# Altium footprint library Electronic Devices_LIB.PcbLib: 410 footprints (part 16 of 26)
Each footprint in its own frame and in the unit in brackets; x right, y up, seen from the top. Pads: shape width x height; smd on the part's side, far side on the other; paste and mask are expansions set on the pad; w line width, h text height; cw(c..) or ccw(c..) is an arc to the next point about the centre after c.
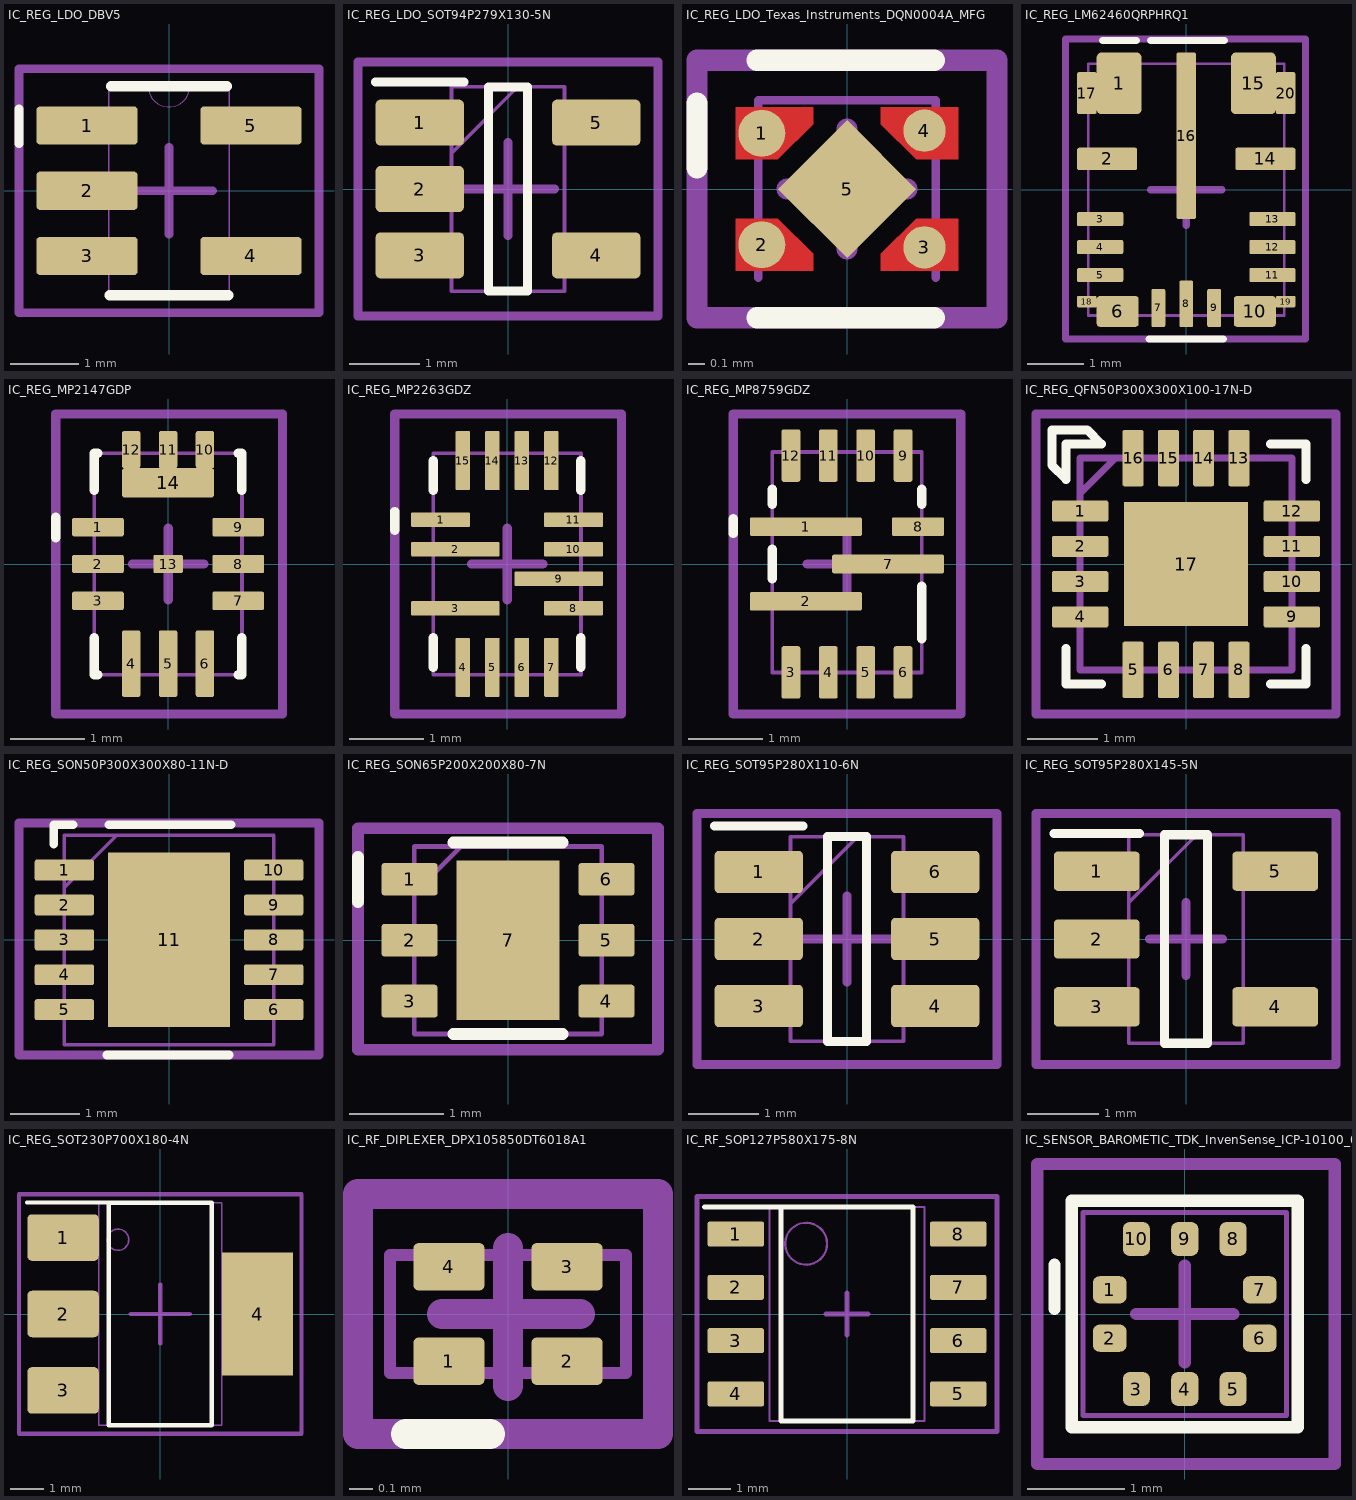
[diagram p15: the footprints below, top view; thin cyan lines are the x and y axes]

## IC_REG_LDO_DBV5 [mil]
pads (5):
  rrect20% 58x22 smd paste-29 mask-29: 1(-47,37.4) 2(-47,0) 3(-47,-37.4) 4(47,-37.4) 5(47,37.4)
Top Overlay:
  lines w5: -86,27 -86,47
  lines w6: -34,-60 34,-60 ; -33,60 33,60
Top Assembly:
  text ".Designator" at -98,-6.34 h20
Top Courtyard:
  lines w5: -25,0 0,0 ; 0,-25 0,0 ; 0,25 0,0 ; 25,0 0,0 ; -86,-70 86,-70 86,70 -86,70 -86,-70
Top 3D Body:
  lines w0: -12,60 ccw(c0,60) 12,60
  lines w1: -59,-47.4 -34.5,-47.4 -34.5,-27.4 -59,-27.4 -59,-47.4 ; -59,-10 -34.5,-10 -34.5,10 -59,10 -59,-10 ; -59,27.4 -34.5,27.4 -34.5,47.4 -59,47.4 -59,27.4 ; -34.5,-60 -34.5,60 34.5,60 34.5,-60 -34.5,-60 ; 34.5,-47.4 59,-47.4 59,-27.4 34.5,-27.4 34.5,-47.4 ; 34.5,27.4 59,27.4 59,47.4 34.5,47.4 34.5,27.4
3D body "DBV5.step": height 57.09, standoff 0, extent -59.02,-60 59.02,60

## IC_REG_LDO_SOT94P279X130-5N [mm]
pads (5):
  rrect20% 1.25x0.65 smd: 1(-1.25,0.94) 2(-1.25,0) 3(-1.25,-0.94) 4(1.25,-0.94) 5(1.25,0.94)
Top Overlay:
  lines w0.127: -1.875,1.514 -0.625,1.514 ; -0.275,-1.448 -0.275,1.448 0.275,1.448 0.275,-1.448 -0.275,-1.448
Top Assembly:
  lines w0.051: -0.8,0.508 0.14,1.448 ; -0.8,-1.448 -0.8,1.448 0.8,1.448 0.8,-1.448 -0.8,-1.448
  text ".Designator" at -2.565,-0.161 h0.51
Top Courtyard:
  lines w0.127: -0.66,0 0,0 ; 0,-0.66 0,0 ; 0,0.66 0,0 ; 0.66,0 0,0 ; -2.125,-1.8 -2.125,1.8 2.125,1.8 2.125,-1.8 -2.125,-1.8
3D body "RT9043GB.stp": height 1.3, standoff 0, extent -1.397,-1.448 1.397,1.448

## IC_REG_LDO_Texas_Instruments_DQN0004A_MFG [mm] "4-XDFN Exposed Pad"
height 0.4
pads (5):
  round 0.279 smd: 1(-0.505,0.33) 2(-0.505,-0.33)
  round 0.251 smd: 3(0.459,-0.346) 4(0.459,0.346)
  rect 0.58x0.58 smd rot 135 mask+0.051: 5(0,0)
Top Layer:
  region: -0.66,-0.485 -0.2,-0.485 -0.2,-0.385 -0.41,-0.175 -0.66,-0.175
  region: 0.66,0.485 0.2,0.485 0.2,0.385 0.41,0.175 0.66,0.175
  region: 0.66,-0.485 0.2,-0.485 0.2,-0.385 0.41,-0.175 0.66,-0.175
  region: -0.66,0.485 -0.2,0.485 -0.2,0.385 -0.41,0.175 -0.66,0.175
Top Overlay:
  lines w0.127: -0.889,0.127 -0.889,0.508 ; -0.533,-0.762 0.517,-0.762 ; -0.533,0.762 0.517,0.762
Top Paste:
  region: -0.318,0 0,-0.318 0.318,0 0,0.318
  region: 0.65,-0.435 0.25,-0.435 0.25,-0.405 0.43,-0.225 0.65,-0.225
  region: -0.65,-0.435 -0.25,-0.435 -0.25,-0.405 -0.43,-0.225 -0.65,-0.225
  region: 0.65,0.435 0.25,0.435 0.25,0.405 0.43,0.225 0.65,0.225
  region: -0.65,0.435 -0.25,0.435 -0.25,0.405 -0.43,0.225 -0.65,0.225
Top Solder:
  region: -0.339,0 0,-0.339 0.339,0 0,0.339
  region: -0.61,-0.435 -0.25,-0.435 -0.25,-0.405 -0.43,-0.225 -0.61,-0.225
  region: 0.61,-0.435 0.25,-0.435 0.25,-0.405 0.43,-0.225 0.61,-0.225
  region: 0.61,0.435 0.25,0.435 0.25,0.405 0.43,0.225 0.61,0.225
  region: -0.61,0.435 -0.25,0.435 -0.25,0.405 -0.43,0.225 -0.61,0.225
Top Assembly:
  lines w0.051: -0.525,-0.525 -0.525,0.525 0.525,0.525 0.525,-0.525
  text ".Designator" at -2.21,-0.136 h0.51
Top Courtyard:
  lines w0.127: -0.356,0 0,0 ; 0,-0.356 0,0 ; 0,0.356 0,0 ; 0.356,0 0,0 ; -0.889,-0.762 0.889,-0.762 0.889,0.762 -0.889,0.762 -0.889,-0.762
3D body "IC_Texas_Instruments_LP590715QDQNRQ1_eec.STEP": height 0.25, standoff 0, extent -0.76,-0.625 0.76,0.625

## IC_REG_LM62460QRPHRQ1 [mm] "16-PowerVFQFN"
height 1
pads (20):
  rrect20% 0.8x1.1 smd mask+0.051: 1(-1.2,1.9) 15(1.2,1.9)
  rrect20% 1.075x0.4 smd mask+0.051: 2(-1.413,0.55) 14(1.413,0.55)
  rrect20% 0.825x0.25 smd mask+0.051: 3(-1.538,-0.525) 4(-1.538,-1.025) 5(-1.538,-1.525) 11(1.538,-1.525) 12(1.538,-1.025) 13(1.538,-0.525)
  rrect20% 0.75x0.55 smd mask+0.051: 6(-1.225,-2.175) 10(1.225,-2.175)
  rrect20% 0.25x0.675 smd mask+0.051: 7(-0.5,-2.113) 9(0.5,-2.113)
  rrect20% 0.25x0.825 smd mask+0.051: 8(0,-2.038)
  rrect20% 0.35x2.975 smd mask+0.051: 16(0,0.963)
  rrect20% 0.35x0.75 smd mask+0.051: 17(-1.775,1.725) 20(1.775,1.725)
  rrect20% 0.35x0.2 smd mask+0.051: 18(-1.775,-2) 19(1.775,-2)
Top Overlay:
  lines w0.127: -1.499,2.667 -0.889,2.667 ; -0.66,-2.667 0.66,-2.667 ; -0.635,2.667 0.686,2.667
Top Assembly:
  lines w0.051: -1.75,-2.25 1.75,-2.25 1.75,2.25 -1.75,2.25 -1.75,-2.25
  text ".Designator" at -2.616,-0.059 h0.51
Top Courtyard:
  lines w0.127: -0.635,0 0,0 ; 0,-0.635 0,0 ; 0,0.635 0,0 ; 0.635,0 0,0 ; -2.159,-2.667 -2.159,2.692 2.134,2.692 2.134,-2.667 -2.159,-2.667
3D body "LM61480Q3RPHRQ1.stp": height 1.1, standoff 0, extent -1.75,-2.25 1.75,2.25

## IC_REG_MP2147GDP [mm] "12-QFN (2x3)"
height 1
pads (14):
  rrect20% 0.7x0.25 smd: 1(-0.95,0.5) 2(-0.95,0) 3(-0.95,-0.5) 7(0.95,-0.5) 8(0.95,0) 9(0.95,0.5)
  rrect20% 0.25x0.9 smd: 4(-0.5,-1.35) 5(0,-1.35) 6(0.5,-1.35)
  rrect20% 0.25x0.5 smd: 10(0.5,1.55) 11(0,1.55) 12(-0.5,1.55)
  rrect20% 0.4x0.25 smd: 13(0,0)
  rrect20% 1.25x0.4 smd: 14(0,1.1)
Top Overlay:
  lines w0.127: -1.524,0.356 -1.524,0.635 ; -1,-1 -1,-1.5 -0.95,-1.5 ; -1,1 -1,1.5 -0.95,1.5 ; 0.95,-1.5 1,-1.5 1,-1 ; 0.95,1.5 1,1.5 1,1
Top Assembly:
  lines w0.051: -1,-1.5 1,-1.5 1,1.5 -1,1.5 -1,-1.5
  text ".Designator" at -2.489,-0.136 h0.51
Top Courtyard:
  lines w0.127: -0.483,0 0,0 ; 0,-0.483 0,0 ; 0,0.483 0,0 ; 0.483,0 0,0 ; -1.524,-2.032 1.549,-2.032 1.549,2.032 -1.524,2.032 -1.524,-2.032
3D body "MP2147GD-P.stp": height 1.1, standoff 0, extent -1,-1.5 1,1.5

## IC_REG_MP2263GDZ [mm] "15-QFN (3x2)"
height 1
pads (15):
  rrect20% 0.8x0.2 smd: 1(-0.9,0.6) 8(0.9,-0.6) 10(0.9,0.2) 11(0.9,0.6)
  rrect20% 1.2x0.2 smd: 2(-0.7,0.2) 3(-0.7,-0.6) 9(0.7,-0.2)
  rrect20% 0.2x0.8 smd: 4(-0.6,-1.4) 5(-0.2,-1.4) 6(0.2,-1.4) 7(0.6,-1.4) 12(0.6,1.4) 13(0.2,1.4) 14(-0.2,1.4) 15(-0.6,1.4)
Top Overlay:
  lines w0.127: -1.524,0.457 -1.524,0.711 ; -1,-1.4 -1,-1 ; -1,1 -1,1.4 ; 1,-1.4 1,-1 ; 1,1 1,1.4
Top Assembly:
  lines w0.051: -1,-1.5 -1,1.5 1,1.5 1,-1.5 -1,-1.5
  text ".Designator" at -2.591,-0.186 h0.51
Top Courtyard:
  lines w0.127: -0.483,0 0,0 ; 0,-0.483 0,0 ; 0,0.483 0,0 ; 0.483,0 0,0 ; -1.524,-2.032 -1.524,2.032 1.549,2.032 1.549,-2.032 -1.524,-2.032
3D body "MP2263GD-Z.stp": height 1.1, standoff 0, extent -1,-1.5 1,1.5

## IC_REG_MP8759GDZ [mm] "12-QFN (2x3)"
height 1
pads (12):
  rrect20% 1.5x0.25 smd: 1(-0.55,0.5) 2(-0.55,-0.5) 7(0.55,0)
  rrect20% 0.25x0.7 smd: 3(-0.75,-1.45) 4(-0.25,-1.45) 5(0.25,-1.45) 6(0.75,-1.45) 9(0.75,1.45) 10(0.25,1.45) 11(-0.25,1.45) 12(-0.75,1.45)
  rrect20% 0.7x0.25 smd: 8(0.95,0.5)
Top Overlay:
  lines w0.127: -1.524,0.408 -1.524,0.608 ; -1,-0.2 -1,0.2 ; -1,0.8 -1,1 ; 1,-1 1,-0.3 ; 1,0.8 1,1
Top Assembly:
  lines w0.051: -1,-1.45 -1,1.5 1,1.5 1,-1.45 -1,-1.45
  text ".Designator" at -2.464,-0.11 h0.51
Top Courtyard:
  lines w0.127: -0.533,0 0,0 ; 0,-0.533 0,0 ; 0,0.533 0,0 ; 0.533,0 0,0 ; -1.524,-2.007 1.524,-2.007 1.524,2.007 -1.524,2.007 -1.524,-2.007
3D body "MP8759GD-Z.stp": height 1, standoff 0, extent -1.03,-1.53 1.03,1.53

## IC_REG_QFN50P300X300X100-17N-D [mm]
pads (17):
  rrect20% 0.8x0.3 smd: 1(-1.5,0.75) 2(-1.5,0.25) 3(-1.5,-0.25) 4(-1.5,-0.75) 9(1.5,-0.75) 10(1.5,-0.25) 11(1.5,0.25) 12(1.5,0.75)
  rrect20% 0.3x0.8 smd: 5(-0.75,-1.5) 6(-0.25,-1.5) 7(0.25,-1.5) 8(0.75,-1.5) 13(0.75,1.5) 14(0.25,1.5) 15(-0.25,1.5) 16(-0.75,1.5)
  rect 1.75x1.75 smd: 17(0,0)
Top Overlay:
  lines w0.127: -1.7,-1.2 -1.7,-1.7 -1.2,-1.7 ; 1.2,-1.7 1.7,-1.7 1.7,-1.2 ; 1.2,1.7 1.7,1.7 1.7,1.2 ; -1.9,1.4 -1.7,1.2 -1.7,1.7 -1.2,1.7 -1.4,1.9 -1.9,1.9 -1.9,1.4
Top Courtyard:
  lines w0.127: -0.45,0 0,0 ; 0,-0.45 0,0 ; 0,0.45 0,0 ; 0.45,0 0,0 ; -2.125,-2.125 2.125,-2.125 2.125,2.125 -2.125,2.125 -2.125,-2.125
Top 3D Body:
  lines w0.1: -1.5,1 -1,1.5 ; -1.5,-1.5 1.5,-1.5 1.5,1.5 -1.5,1.5 -1.5,-1.5
3D body "TPS62133RGTR.stp": height 1, standoff 0, extent -1.5,-1.5 1.5,1.5

## IC_REG_SON50P300X300X80-11N-D [mm] "10-WFDFN Exposed Pad"
height 0.8
pads (11):
  rrect20% 0.85x0.3 smd mask+0.076: 1(-1.5,1) 2(-1.5,0.5) 3(-1.5,0) 4(-1.5,-0.5) 5(-1.5,-1) 6(1.5,-1) 7(1.5,-0.5) 8(1.5,0) 9(1.5,0.5) 10(1.5,1)
  rect 1.75x2.5 smd: 11(0,0)
Top Overlay:
  lines w0.127: -1.651,1.372 -1.651,1.651 -1.372,1.651 ; -0.889,-1.651 0.864,-1.651 ; -0.864,1.651 0.889,1.651
Top Assembly:
  lines w0.051: -1.5,0.75 -0.75,1.5 ; -1.5,-1.5 -1.5,1.5 1.5,1.5 1.5,-1.5 -1.5,-1.5
  text ".Designator" at -2.565,-0.161 h0.51
Top Courtyard:
  lines w0.127: -2.15,-1.651 2.15,-1.651 2.15,1.676 -2.15,1.676 -2.15,-1.651
3D body "TPS7A9401DSCR.stp": height 0.8, standoff 0, extent -1.55,-1.5 1.55,1.5

## IC_REG_SON65P200X200X80-7N [mm] "SOT-23-6 Thin, TSOT-23-6"
height 1.1
pads (7):
  rrect20% 0.6x0.35 smd: 1(-1.05,0.65) 2(-1.05,0) 3(-1.05,-0.65) 4(1.05,-0.65) 5(1.05,0) 6(1.05,0.65)
  rect 1.1x1.7 smd mask+0.051: 7(0,0)
Top Overlay:
  lines w0.127: -1.6,0.406 -1.6,0.889 ; -0.584,-1 0.584,-1 ; -0.584,1.041 0.584,1.041
Top Assembly:
  lines w0.051: -1,0.5 -0.5,1 ; -1,-1 -1,1 1,1 1,-1 -1,-1
  text ".Designator" at -2.54,-0.161 h0.51
Top Courtyard:
  lines w0.127: -0.432,0 0,0 ; 0,-0.432 0,0 ; 0,0.432 0,0 ; 0.432,0 0,0 ; -1.6,-1.168 -1.6,1.194 1.6,1.194 1.6,-1.168 -1.6,-1.168
3D body "TPS61240TDRVRQ1.stp": height 0.8, standoff 0, extent -1,-1 1,1

## IC_REG_SOT95P280X110-6N [mm] "SOT-23-6 Thin, TSOT-23-6"
height 1.1
pads (6):
  rrect20% 1.25x0.6 smd: 1(-1.25,0.95) 2(-1.25,0) 3(-1.25,-0.95) 4(1.25,-0.95) 5(1.25,0) 6(1.25,0.95)
Top Overlay:
  lines w0.127: -1.875,1.6 -0.625,1.6 ; -0.275,-1.45 0.275,-1.45 0.275,1.45 -0.275,1.45 -0.275,-1.45
Top Assembly:
  lines w0.051: -0.8,0.5 0.15,1.45 ; -0.8,-1.45 -0.8,1.45 0.8,1.45 0.8,-1.45 -0.8,-1.45
  text ".Designator" at -2.616,-0.186 h0.51
Top Courtyard:
  lines w0.127: -0.61,0 0,0 ; 0,-0.61 0,0 ; 0,0.61 0,0 ; 0.61,0 0,0 ; -2.125,-1.775 2.125,-1.775 2.125,1.775 -2.125,1.775 -2.125,-1.775
3D body "TPS562200DDCT.stp": height 0.97, standoff 0, extent -1.4,-1.45 1.4,1.45

## IC_REG_SOT95P280X145-5N [mm] "SOT-23-5"
height 1.45
pads (5):
  rrect20% 1.2x0.55 smd: 1(-1.25,0.95) 2(-1.25,0) 3(-1.25,-0.95) 4(1.25,-0.95) 5(1.25,0.95)
Top Overlay:
  lines w0.127: -1.85,1.475 -0.65,1.475 ; -0.3,-1.46 0.3,-1.46 0.3,1.46 -0.3,1.46 -0.3,-1.46
Top Assembly:
  lines w0.051: -0.8,0.51 0.15,1.46 ; -0.8,-1.46 0.8,-1.46 0.8,1.46 -0.8,1.46 -0.8,-1.46
  text ".Designator" at -2.667,-0.161 h0.51
Top Courtyard:
  lines w0.127: -0.508,0 0,0 ; 0,-0.508 0,0 ; 0,0.508 0,0 ; 0.508,0 0,0 ; -2.1,-1.76 2.1,-1.76 2.1,1.76 -2.1,1.76 -2.1,-1.76
3D body "AP2202K-3.3TRG1.stp": height 1.45, standoff 0, extent -1.4,-1.46 1.4,1.46

## IC_REG_SOT230P700X180-4N [mm] "SOT223, 4-Leads, Body 6.50x7.00mm (avg), Pitch 2.30mm, IPC Medium Density"
height 1.8
pads (4):
  rrect20% 2.15x1.4 smd: 1(-2.925,2.3) 2(-2.925,0) 3(-2.925,-2.3)
  rect 2.15x3.7 smd: 4(2.925,0)
Top Overlay:
  lines w0.127: -4.013,3.353 -1.55,3.353 -1.55,-3.35 1.55,-3.35 1.55,3.35 -1.55,3.35
Top Assembly:
  circle w0.051: c-1.27,2.235 r0.321
  lines w0.051: -1.85,-3.35 1.85,-3.35 1.85,3.35 -1.85,3.35 -1.85,-3.35
  text ".Designator" at -2.616,-0.161 h0.51
Top Courtyard:
  lines w0.127: -0.889,0 0,0 ; 0,-0.889 0,0 ; 0,0.889 0,0 ; 0.889,0 0,0 ; -4.25,-3.6 4.25,-3.6 4.25,3.6 -4.25,3.6 -4.25,-3.6
3D body "AZ1117IH-5.0TRG1.STEP": height 1.65, standoff 0, extent -3.5,-3.199 3.5,3.301

## IC_RF_DIPLEXER_DPX105850DT6018A1 [mm] "0402 (1005 Metric), 4 PC Pad"
height 0.5
pads (4):
  rrect20% 0.3x0.2 smd: 1(-0.25,-0.2) 2(0.25,-0.2) 3(0.25,0.2) 4(-0.25,0.2)
Top Overlay:
  lines w0.127: -0.432,-0.508 -0.076,-0.508
Top Assembly:
  lines w0.051: -0.5,-0.25 0.5,-0.25 0.5,0.25 -0.5,0.25 -0.5,-0.25
  text ".Designator" at -2.591,-0.212 h0.51
Top Courtyard:
  lines w0.127: -0.279,0 0,0 0,0.279 ; 0,-0.305 0,-0.025 ; 0.025,0 0.305,0 ; -0.635,-0.508 0.635,-0.508 0.635,0.508 -0.635,0.508 -0.635,-0.508
3D body "DPX105850DT-6018A1.stp": height 0.43, standoff 0, extent -0.5,-0.25 0.5,0.25

## IC_RF_SOP127P580X175-8N [mm] "SOP, 8-Leads, Body 5.10x3.70mm, Pitch 1.27mm, IPC Medium Density"
height 1.75
pads (8):
  rrect20% 1.35x0.6 smd: 1(-2.65,1.905) 2(-2.65,0.635) 3(-2.65,-0.635) 4(-2.65,-1.905) 5(2.65,-1.905) 6(2.65,-0.635) 7(2.65,0.635) 8(2.65,1.905)
Top Overlay:
  lines w0.127: -3.394,2.55 -1.575,2.55 ; -1.575,2.55 1.575,2.55 1.575,-2.55 -1.575,-2.55 -1.575,2.55
Top Assembly:
  circle w0.051: c-0.975,1.675 r0.5
  lines w0.051: -1.85,-2.55 1.85,-2.55 1.85,2.55 -1.85,2.55 -1.85,-2.55
  text ".Designator" at -2.413,-0.212 h0.51
Top Courtyard:
  lines w0.127: -0.5,0 0.5,0 ; 0,-0.5 0,0.5 ; -3.575,-2.8 3.575,-2.8 3.575,2.8 -3.575,2.8 -3.575,-2.8
3D body "IC_RF_SOP127P580X175-8N.step": height 1.75, standoff 0, extent -2.9,-2.55 2.9,2.55

## IC_SENSOR_BAROMETIC_TDK_InvenSense_ICP-10100_0 [mm]
pads (10):
  rrect50% 0.35x0.28 smd: 1(-0.775,0.25) 2(-0.775,-0.25) 6(0.775,-0.25) 7(0.775,0.25)
  rrect50% 0.28x0.35 smd: 3(-0.5,-0.775) 4(0,-0.775) 5(0.5,-0.775) 8(0.5,0.775) 9(0,0.775) 10(-0.5,0.775)
Top Overlay:
  lines w0.127: -1.346,0.051 -1.346,0.508 ; -1.168,-1.168 -1.168,1.168 1.168,1.168 1.168,-1.168 -1.168,-1.168
Top Assembly:
  lines w0.051: -1.05,-1.05 1.05,-1.05 1.05,1.05 -1.05,1.05 -1.05,-1.05
  text ".Designator" at -2.515,-0.237 h0.51
Top Courtyard:
  lines w0.127: -0.5,0 0.5,0 ; 0,-0.5 0,0.5 ; -1.524,-1.549 1.549,-1.549 1.549,1.549 -1.524,1.549 -1.524,-1.549
3D body "IC_TDK_InvenSense_ICP-10100_eec.STEP": height 0.25, standoff 0, extent -1.55,-1.55 1.55,1.55